# Altium footprint library pw.PcbLib: 210 footprints (part 12 of 14)
Each footprint in its own frame and in the unit in brackets; x right, y up, seen from the top. Pads: shape width x height; smd on the part's side, far side on the other; paste and mask are expansions set on the pad; w line width, h text height; cw(c..) or ccw(c..) is an arc to the next point about the centre after c.
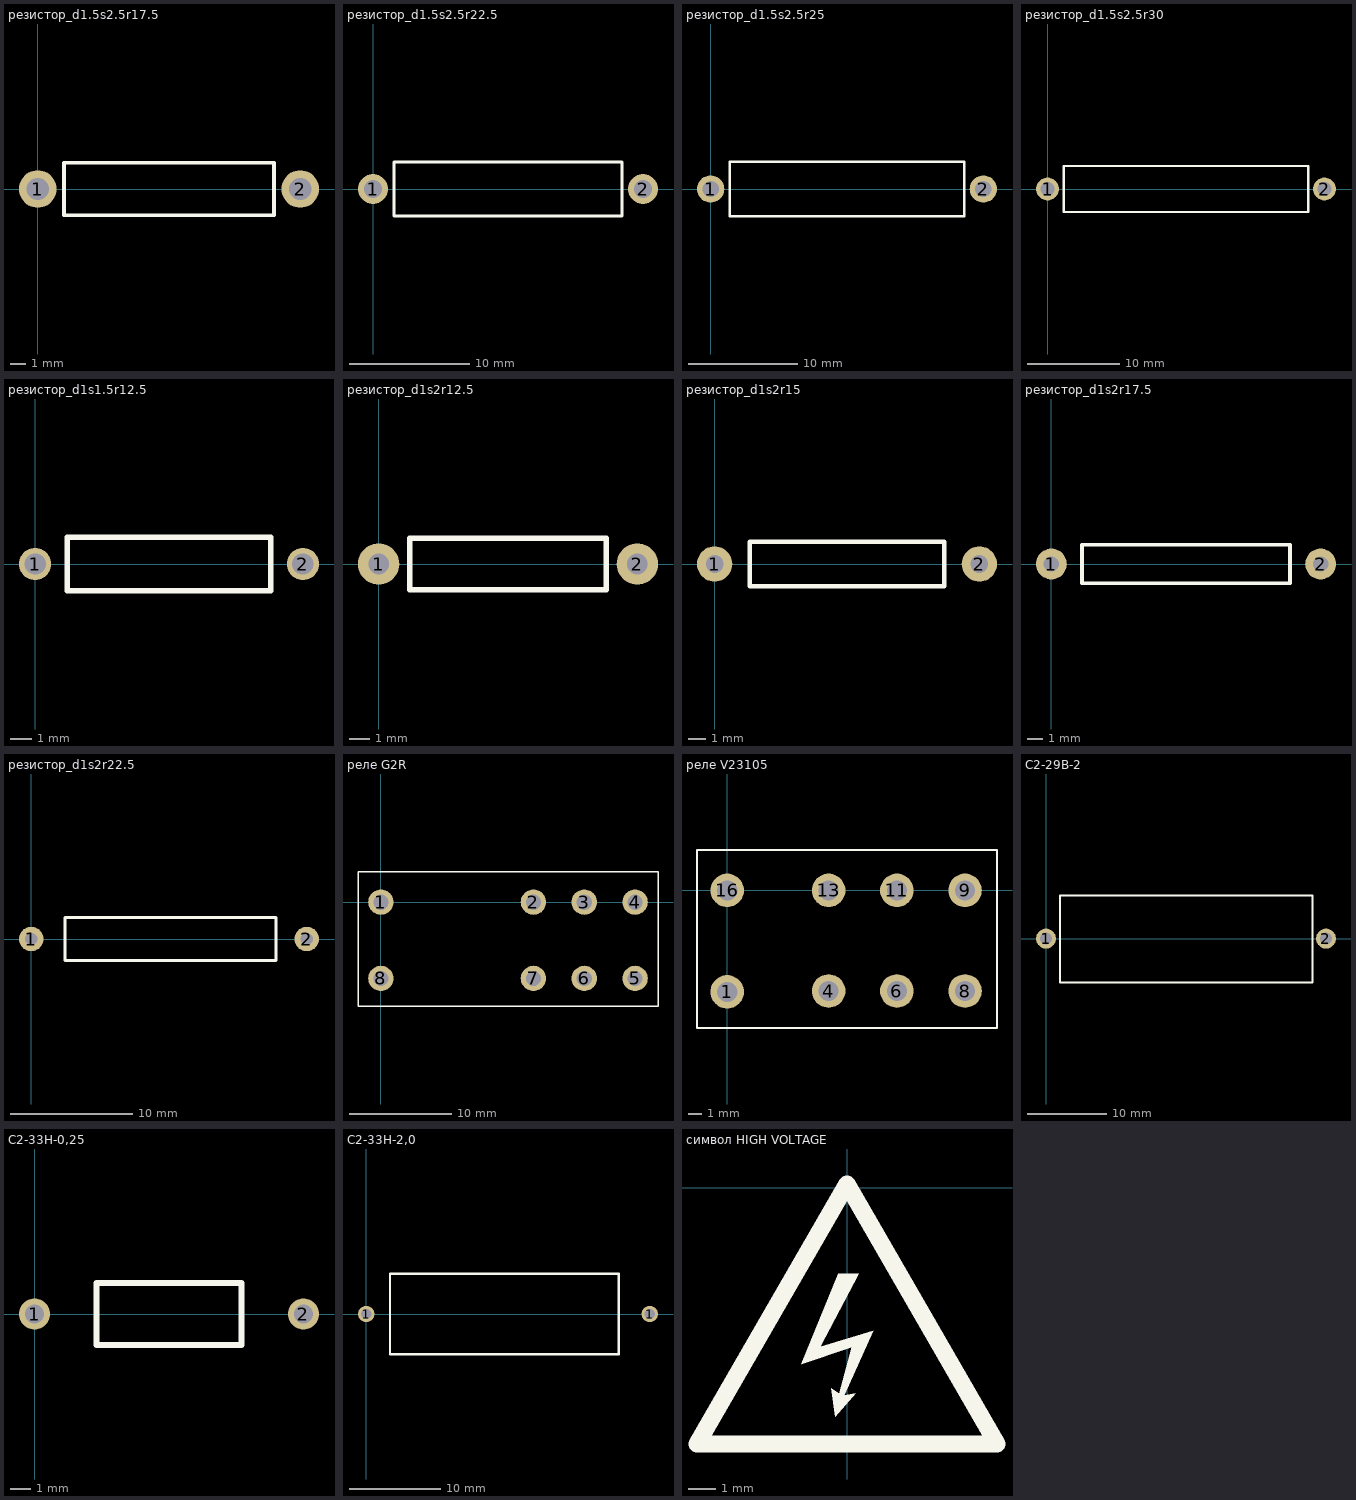
[diagram p11: the footprints below, top view; thin cyan lines are the x and y axes]

## резистор_d1.5s2.5r17.5 [mm]
pads (2):
  round 2.5 hole 1.5: 1(0,0) 2(17.5,0)
Top Overlay:
  lines w0.254: 1.75,-1.75 1.75,1.75 7.063,1.75 15.75,1.75 15.75,-1.75 1.75,-1.75
3D body "RESAD1750W80L1200D450_1W.STEP": height 4.25, standoff -3, extent -0.4,-2.25 17.9,2.25

## резистор_d1.5s2.5r22.5 [mm]
pads (2):
  round 2.5 hole 1.5: 1(0,0) 2(22.5,0)
Top Overlay:
  lines w0.254: 1.75,-2.25 1.75,2.25 7.563,2.25 20.75,2.25 20.75,-2.25 1.75,-2.25
3D body "RESAD2250W80L1200D450_1W.STEP": height 4.25, standoff -3, extent -0.4,-2.25 22.9,2.25

## резистор_d1.5s2.5r25 [mm]
pads (2):
  round 2.5 hole 1.5: 1(0,0) 2(25,0)
Top Overlay:
  lines w0.254: 1.75,-2.5 1.75,2.5 23.25,2.5 23.25,-2.5 1.75,-2.5
3D body "RESAD2500W80L1200D450_1W.STEP": height 4.25, standoff -3, extent -0.4,-2.25 25.4,2.25

## резистор_d1.5s2.5r30 [mm]
pads (2):
  round 2.5 hole 1.5: 1(0,0) 2(30,0)
Top Overlay:
  lines w0.254: 1.75,-2.5 28.25,-2.5 28.25,2.5 1.75,2.5 1.75,-2.5
3D body "RESAD3000W80L1200D450_1W.STEP": height 4.25, standoff -3, extent -0.4,-2.25 30.4,2.25

## резистор_d1s1.5 [mm]

## резистор_d1s1.5r12.5 [mm]
pads (2):
  round 1.5 hole 1: 1(0,0) 2(12.5,0)
Top Overlay:
  lines w0.254: 1.5,-1.25 11,-1.25 11,1.25 1.5,1.25 1.5,-1.25
3D body "RESAD1250W60L650D230_0.25W.STEP": height 3.15, standoff -1.5, extent -0.3,-1.15 12.8,1.15

## резистор_d1s2r12.5 [mm]
pads (2):
  round 2 hole 1: 1(0,0) 2(12.5,0)
Top Overlay:
  lines w0.254: 1.5,-1.25 11,-1.25 11,1.25 1.5,1.25 1.5,-1.25
3D body "RESAD1000W50L320D180_0.125W.STEP": height 0.9, standoff -0.9, extent 1,-2.25 11.5,2.15

## резистор_d1s2r15 [mm]
pads (2):
  round 2 hole 1: 1(0,0) 2(15,0)
Top Overlay:
  lines w0.254: 2,-1.25 13,-1.25 13,1.25 2,1.25 2,-1.25
3D body "RESAD1500W60L900D320_0.5W.STEP": height 4.6, standoff -1.75, extent -0.3,-1.6 15.3,1.6

## резистор_d1s2r17.5 [mm]
pads (2):
  round 2 hole 1: 1(0,0) 2(17.5,0)
Top Overlay:
  lines w0.254: 2,-1.25 2,1.25 15.5,1.25 15.5,-1.25 2,-1.25

## резистор_d1s2r22.5 [mm]
pads (2):
  round 2 hole 1: 1(0,0) 2(22.5,0)
Top Overlay:
  lines w0.254: 2.75,-1.75 2.75,1.75 7.063,1.75 15.687,1.75 20,1.75 20,-1.75 2.75,-1.75

## реле G2R [mm]
pads (8):
  round 2.5 hole 1.5: 1(0,0) 2(15,0) 3(20,0) 4(25,0) 5(25,-7.5) 6(20,-7.5) 7(15,-7.5) 8(0,-7.5)
Top Overlay:
  lines w0.125: -2.25,-10.25 27.25,-10.25 27.25,3 -2.25,3 -2.25,-10.25
3D body "User Library-OMRON G2R-2 RELAY.STEP": height 26.46, standoff -3.51, extent -2,-10.025 26.956,2.7

## реле V23105 [mm]
pads (8):
  round 2.5 hole 1.5: 1(0,-7.56) 4(7.56,-7.5) 6(12.64,-7.5) 8(17.72,-7.5) 9(17.72,0) 11(12.64,0) 13(7.56,0) 16(0,0)
Top Overlay:
  lines w0.125: -2.25,-10.25 20.1,-10.25 20.1,-6.937 20.1,-0.313 20.1,3 -2.25,3 -2.25,-10.25
3D body "User Library-V23105A5301A201.STEP": height 11.41, standoff -2.3, extent -1.2,-8.8 19,1.2

## С2-29B-2 [mm]
pads (2):
  round 2.5 hole 1.5: 1(0,0) 2(35,0)
Top Overlay:
  lines w0.254: 1.75,-5.5 33.3,-5.5 33.3,5.4 1.75,5.4 1.75,-5.5
3D body "User Library-RES 6W -H  L=24 D=8 d=0,8 Pin2Pin=30,48.STEP": height 8, standoff -3.54, extent 1.66,-3.9 32.94,4.101

## С2-33Н-0,25 [mm]
pads (2):
  round 1.5 hole 0.9 unplated: 1(0,0) 2(13,0)
Top Overlay:
  lines w0.3: 3,-1.5 3,0 3,1.5 10,1.5 10,0 10,-1.5 3,-1.5

## С2-33Н-2,0 [mm]
pads (2):
  round 1.8 hole 1.1 unplated: 1(0,0) 1(31,0)
Top Overlay:
  lines w0.25: 2.6,-4.4 2.6,0 2.6,4.4 27.6,4.4 27.6,0 27.6,-4.4 2.6,-4.4

## символ HIGH VOLTAGE [mm]
Top Overlay:
  region: -0.33,-3.15 0.432,-3.15 -0.991,-5.842 0.965,-5.258 -0.102,-7.62 0.33,-7.544 -0.432,-8.407 -0.584,-7.366 -0.279,-7.569 0.178,-5.867 -1.676,-6.477
  lines w0.635: -5.512,-9.411 0,0.136 5.512,-9.411 -5.512,-9.411